# Altium footprint library ref-packages.PCBLIB: 1544 footprints (part 44 of 103) (continued)
## PQFP164 [mm] (continued)
  text "1" at -12.96,-13.93 h1.97
Mechanical 16:
  drawing of 328 lines, arcs and shapes, not listed
Mechanical 27:
  lines w0.2: -16.9,-16.9 -16.9,16.9 16.9,16.9 16.9,-16.9 -16.9,-16.9

## PQFP196 [mm]
pads (196):
  rect 0.35x1.8 smd: 1(-15.24,-18.3) 2(-14.605,-18.3) 3(-13.97,-18.3) 4(-13.335,-18.3) 5(-12.7,-18.3) 6(-12.065,-18.3) 7(-11.43,-18.3) 8(-10.795,-18.3) 9(-10.16,-18.3) 10(-9.525,-18.3) 11(-8.89,-18.3) 12(-8.255,-18.3) 13(-7.62,-18.3) 14(-6.985,-18.3) 15(-6.35,-18.3) 16(-5.715,-18.3) 17(-5.08,-18.3) 18(-4.445,-18.3) 19(-3.81,-18.3) 20(-3.175,-18.3) 21(-2.54,-18.3) 22(-1.905,-18.3) 23(-1.27,-18.3) 24(-0.635,-18.3) 25(0,-18.3) 26(0.635,-18.3) 27(1.27,-18.3) 28(1.905,-18.3) 29(2.54,-18.3) 30(3.175,-18.3) 31(3.81,-18.3) 32(4.445,-18.3) 33(5.08,-18.3) 34(5.715,-18.3) 35(6.35,-18.3) 36(6.985,-18.3) 37(7.62,-18.3) 38(8.255,-18.3) 39(8.89,-18.3) 40(9.525,-18.3) 41(10.16,-18.3) 42(10.795,-18.3) 43(11.43,-18.3) 44(12.065,-18.3) 45(12.7,-18.3) 46(13.335,-18.3) 47(13.97,-18.3) 48(14.605,-18.3) 49(15.24,-18.3) 99(15.24,18.3) 100(14.605,18.3) 101(13.97,18.3) 102(13.335,18.3) 103(12.7,18.3) 104(12.065,18.3) 105(11.43,18.3) 106(10.795,18.3) 107(10.16,18.3) 108(9.525,18.3) 109(8.89,18.3) 110(8.255,18.3) 111(7.62,18.3) 112(6.985,18.3) 113(6.35,18.3) 114(5.715,18.3) 115(5.08,18.3) 116(4.445,18.3) 117(3.81,18.3) 118(3.175,18.3) 119(2.54,18.3) 120(1.905,18.3) 121(1.27,18.3) 122(0.635,18.3) 123(0,18.3) 124(-0.635,18.3) 125(-1.27,18.3) 126(-1.905,18.3) 127(-2.54,18.3) 128(-3.175,18.3) 129(-3.81,18.3) 130(-4.445,18.3) 131(-5.08,18.3) 132(-5.715,18.3) 133(-6.35,18.3) 134(-6.985,18.3) 135(-7.62,18.3) 136(-8.255,18.3) 137(-8.89,18.3) 138(-9.525,18.3) 139(-10.16,18.3) 140(-10.795,18.3) 141(-11.43,18.3) 142(-12.065,18.3) 143(-12.7,18.3) 144(-13.335,18.3) 145(-13.97,18.3) 146(-14.605,18.3) 147(-15.24,18.3)
  rect 1.8x0.35 smd: 50(18.3,-15.24) 51(18.3,-14.605) 52(18.3,-13.97) 53(18.3,-13.335) 54(18.3,-12.7) 55(18.3,-12.065) 56(18.3,-11.43) 57(18.3,-10.795) 58(18.3,-10.16) 59(18.3,-9.525) 60(18.3,-8.89) 61(18.3,-8.255) 62(18.3,-7.62) 63(18.3,-6.985) 64(18.3,-6.35) 65(18.3,-5.715) 66(18.3,-5.08) 67(18.3,-4.445) 68(18.3,-3.81) 69(18.3,-3.175) 70(18.3,-2.54) 71(18.3,-1.905) 72(18.3,-1.27) 73(18.3,-0.635) 74(18.3,0) 75(18.3,0.635) 76(18.3,1.27) 77(18.3,1.905) 78(18.3,2.54) 79(18.3,3.175) 80(18.3,3.81) 81(18.3,4.445) 82(18.3,5.08) 83(18.3,5.715) 84(18.3,6.35) 85(18.3,6.985) 86(18.3,7.62) 87(18.3,8.255) 88(18.3,8.89) 89(18.3,9.525) 90(18.3,10.16) 91(18.3,10.795) 92(18.3,11.43) 93(18.3,12.065) 94(18.3,12.7) 95(18.3,13.335) 96(18.3,13.97) 97(18.3,14.605) 98(18.3,15.24) 148(-18.3,15.24) 149(-18.3,14.605) 150(-18.3,13.97) 151(-18.3,13.335) 152(-18.3,12.7) 153(-18.3,12.065) 154(-18.3,11.43) 155(-18.3,10.795) 156(-18.3,10.16) 157(-18.3,9.525) 158(-18.3,8.89) 159(-18.3,8.255) 160(-18.3,7.62) 161(-18.3,6.985) 162(-18.3,6.35) 163(-18.3,5.715) 164(-18.3,5.08) 165(-18.3,4.445) 166(-18.3,3.81) 167(-18.3,3.175) 168(-18.3,2.54) 169(-18.3,1.905) 170(-18.3,1.27) 171(-18.3,0.635) 172(-18.3,0) 173(-18.3,-0.635) 174(-18.3,-1.27) 175(-18.3,-1.905) 176(-18.3,-2.54) 177(-18.3,-3.175) 178(-18.3,-3.81) 179(-18.3,-4.445) 180(-18.3,-5.08) 181(-18.3,-5.715) 182(-18.3,-6.35) 183(-18.3,-6.985) 184(-18.3,-7.62) 185(-18.3,-8.255) 186(-18.3,-8.89) 187(-18.3,-9.525) 188(-18.3,-10.16) 189(-18.3,-10.795) 190(-18.3,-11.43) 191(-18.3,-12.065) 192(-18.3,-12.7) 193(-18.3,-13.335) 194(-18.3,-13.97) 195(-18.3,-14.605) 196(-18.3,-15.24)
Top Overlay:
  lines w0.203: -18.84,17.252 -18.84,18.014 ; -18.826,17.252 -17.22,15.982 ; -18.826,18.014 -18.064,18.79 -17.302,18.79 ; -18.81,-17.282 -18.81,-18.044 -18.034,-18.806 ; -18.796,-17.282 -17.19,-16.012 ; -18.034,-18.82 -17.272,-18.82 ; -17.302,18.776 -16.032,17.17 ; -17.272,-18.806 -16.002,-17.2 -15.666,-17.2 ; -17.22,-16.022 -17.22,15.9 ; -16.022,17.22 15.9,17.22 ; 15.875,-17.155 15.875,-16.52 -15.666,-16.52 -15.666,-17.2 ; 15.982,17.22 17.252,18.826 ; 16.002,-17.2 -15.666,-17.2 ; 16.032,-17.17 17.302,-18.776 ; 17.17,16.032 18.776,17.302 ; 17.22,-15.982 18.826,-17.252 ; 17.22,-15.9 17.22,16.022 ; 17.252,18.84 18.014,18.84 ; 17.302,-18.79 18.064,-18.79 18.826,-18.014 ; 18.014,18.826 18.79,18.064 18.79,17.302 ; 18.84,-18.014 18.84,-17.252
  text "1" at -15.5,-16.43 h1.08
Mechanical 16:
  drawing of 392 lines, arcs and shapes, not listed
Mechanical 27:
  lines w0.2: -19.9,-19.9 -19.9,19.9 19.9,19.9 19.9,-19.9 -19.9,-19.9

## PQFP208 [mil]
pads (208):
  rect 47.24x12.6 smd: 1(-602.36,501.97) 2(-602.36,482.28) 3(-602.36,462.6) 4(-602.36,442.91) 5(-602.36,423.23) 6(-602.36,403.54) 7(-602.36,383.86) 8(-602.36,364.17) 9(-602.36,344.49) 10(-602.36,324.8) 11(-602.36,305.12) 12(-602.36,285.43) 13(-602.36,265.75) 14(-602.36,246.06) 15(-602.36,226.38) 16(-602.36,206.69) 17(-602.36,187.01) 18(-602.36,167.32) 19(-602.36,147.64) 20(-602.36,127.95) 21(-602.36,108.27) 22(-602.36,88.58) 23(-602.36,68.9) 24(-602.36,49.21) 25(-602.36,29.53) 26(-602.36,9.84) 27(-602.36,-9.84) 28(-602.36,-29.53) 29(-602.36,-49.21) 30(-602.36,-68.9) 31(-602.36,-88.58) 32(-602.36,-108.27) 33(-602.36,-127.95) 34(-602.36,-147.64) 35(-602.36,-167.32) 36(-602.36,-187.01) 37(-602.36,-206.69) 38(-602.36,-226.38) 39(-602.36,-246.06) 40(-602.36,-265.75) 41(-602.36,-285.43) 42(-602.36,-305.12) 43(-602.36,-324.8) 44(-602.36,-344.49) 45(-602.36,-364.17) 46(-602.36,-383.86) 47(-602.36,-403.54) 48(-602.36,-423.23) 49(-602.36,-442.91) 50(-602.36,-462.6) 51(-602.36,-482.28) 52(-602.36,-501.97) 105(602.36,-501.97) 106(602.36,-482.28) 107(602.36,-462.6) 108(602.36,-442.91) 109(602.36,-423.23) 110(602.36,-403.54) 111(602.36,-383.86) 112(602.36,-364.17) 113(602.36,-344.49) 114(602.36,-324.8) 115(602.36,-305.12) 116(602.36,-285.43) 117(602.36,-265.75) 118(602.36,-246.06) 119(602.36,-226.38) 120(602.36,-206.69) 121(602.36,-187.01) 122(602.36,-167.32) 123(602.36,-147.64) 124(602.36,-127.95) 125(602.36,-108.27) 126(602.36,-88.58) 127(602.36,-68.9) 128(602.36,-49.21) 129(602.36,-29.53) 130(602.36,-9.84) 131(602.36,9.84) 132(602.36,29.53) 133(602.36,49.21) 134(602.36,68.9) 135(602.36,88.58) 136(602.36,108.27) 137(602.36,127.95) 138(602.36,147.64) 139(602.36,167.32) 140(602.36,187.01) 141(602.36,206.69) 142(602.36,226.38) 143(602.36,246.06) 144(602.36,265.75) 145(602.36,285.43) 146(602.36,305.12) 147(602.36,324.8) 148(602.36,344.49) 149(602.36,364.17) 150(602.36,383.86) 151(602.36,403.54) 152(602.36,423.23) 153(602.36,442.91) 154(602.36,462.6) 155(602.36,482.28) 156(602.36,501.97)
  rect 12.6x47.24 smd: 53(-501.97,-602.36) 54(-482.28,-602.36) 55(-462.6,-602.36) 56(-442.91,-602.36) 57(-423.23,-602.36) 58(-403.54,-602.36) 59(-383.86,-602.36) 60(-364.17,-602.36) 61(-344.49,-602.36) 62(-324.8,-602.36) 63(-305.12,-602.36) 64(-285.43,-602.36) 65(-265.75,-602.36) 66(-246.06,-602.36) 67(-226.38,-602.36) 68(-206.69,-602.36) 69(-187.01,-602.36) 70(-167.32,-602.36) 71(-147.64,-602.36) 72(-127.95,-602.36) 73(-108.27,-602.36) 74(-88.58,-602.36) 75(-68.9,-602.36) 76(-49.21,-602.36) 77(-29.53,-602.36) 78(-9.84,-602.36) 79(9.84,-602.36) 80(29.53,-602.36) 81(49.21,-602.36) 82(68.9,-602.36) 83(88.58,-602.36) 84(108.27,-602.36) 85(127.95,-602.36) 86(147.64,-602.36) 87(167.32,-602.36) 88(187.01,-602.36) 89(206.69,-602.36) 90(226.38,-602.36) 91(246.06,-602.36) 92(265.75,-602.36) 93(285.43,-602.36) 94(305.12,-602.36) 95(324.8,-602.36) 96(344.49,-602.36) 97(364.17,-602.36) 98(383.86,-602.36) 99(403.54,-602.36) 100(423.23,-602.36) 101(442.91,-602.36) 102(462.6,-602.36) 103(482.28,-602.36) 104(501.97,-602.36) 157(501.97,602.36) 158(482.28,602.36) 159(462.6,602.36) 160(442.91,602.36) 161(423.23,602.36) 162(403.54,602.36) 163(383.86,602.36) 164(364.17,602.36) 165(344.49,602.36) 166(324.8,602.36) 167(305.12,602.36) 168(285.43,602.36) 169(265.75,602.36) 170(246.06,602.36) 171(226.38,602.36) 172(206.69,602.36) 173(187.01,602.36) 174(167.32,602.36) 175(147.64,602.36) 176(127.95,602.36) 177(108.27,602.36) 178(88.58,602.36) 179(68.9,602.36) 180(49.21,602.36) 181(29.53,602.36) 182(9.84,602.36) 183(-9.84,602.36) 184(-29.53,602.36) 185(-49.21,602.36) 186(-68.9,602.36) 187(-88.58,602.36) 188(-108.27,602.36) 189(-127.95,602.36) 190(-147.64,602.36) 191(-167.32,602.36) 192(-187.01,602.36) 193(-206.69,602.36) 194(-226.38,602.36) 195(-246.06,602.36) 196(-265.75,602.36) 197(-285.43,602.36) 198(-305.12,602.36) 199(-324.8,602.36) 200(-344.49,602.36) 201(-364.17,602.36) 202(-383.86,602.36) 203(-403.54,602.36) 204(-423.23,602.36) 205(-442.91,602.36) 206(-462.6,602.36) 207(-482.28,602.36) 208(-501.97,602.36)
Top Overlay:
  drawing of 214 lines, arcs and shapes, not listed
Mechanical 13:
  text "Analog Devices PQFP 208" at -530.32,-530.32 h49.6
Mechanical 16:
  drawing of 208 lines, arcs and shapes, not listed

## PQFP240 [mil]
pads (240):
  rect 47.24x12.6 smd: 1(-669.29,580.71) 2(-669.29,561.02) 3(-669.29,541.34) 4(-669.29,521.65) 5(-669.29,501.97) 6(-669.29,482.28) 7(-669.29,462.6) 8(-669.29,442.91) 9(-669.29,423.23) 10(-669.29,403.54) 11(-669.29,383.86) 12(-669.29,364.17) 13(-669.29,344.49) 14(-669.29,324.8) 15(-669.29,305.12) 16(-669.29,285.43) 17(-669.29,265.75) 18(-669.29,246.06) 19(-669.29,226.38) 20(-669.29,206.69) 21(-669.29,187.01) 22(-669.29,167.32) 23(-669.29,147.64) 24(-669.29,127.95) 25(-669.29,108.27) 26(-669.29,88.58) 27(-669.29,68.9) 28(-669.29,49.21) 29(-669.29,29.53) 30(-669.29,9.84) 31(-669.29,-9.84) 32(-669.29,-29.53) 33(-669.29,-49.21) 34(-669.29,-68.9) 35(-669.29,-88.58) 36(-669.29,-108.27) 37(-669.29,-127.95) 38(-669.29,-147.64) 39(-669.29,-167.32) 40(-669.29,-187.01) 41(-669.29,-206.69) 42(-669.29,-226.38) 43(-669.29,-246.06) 44(-669.29,-265.75) 45(-669.29,-285.43) 46(-669.29,-305.12) 47(-669.29,-324.8) 48(-669.29,-344.49) 49(-669.29,-364.17) 50(-669.29,-383.86) 51(-669.29,-403.54) 52(-669.29,-423.23) 53(-669.29,-442.91) 54(-669.29,-462.6) 55(-669.29,-482.28) 56(-669.29,-501.97) 57(-669.29,-521.65) 58(-669.29,-541.34) 59(-669.29,-561.02) 60(-669.29,-580.71) 121(669.29,-580.71) 122(669.29,-561.02) 123(669.29,-541.34) 124(669.29,-521.65) 125(669.29,-501.97) 126(669.29,-482.28) 127(669.29,-462.6) 128(669.29,-442.91) 129(669.29,-423.23) 130(669.29,-403.54) 131(669.29,-383.86) 132(669.29,-364.17) 133(669.29,-344.49) 134(669.29,-324.8) 135(669.29,-305.12) 136(669.29,-285.43) 137(669.29,-265.75) 138(669.29,-246.06) 139(669.29,-226.38) 140(669.29,-206.69) 141(669.29,-187.01) 142(669.29,-167.32) 143(669.29,-147.64) 144(669.29,-127.95) 145(669.29,-108.27) 146(669.29,-88.58) 147(669.29,-68.9) 148(669.29,-49.21) 149(669.29,-29.53) 150(669.29,-9.84) 151(669.29,9.84) 152(669.29,29.53) 153(669.29,49.21) 154(669.29,68.9) 155(669.29,88.58) 156(669.29,108.27) 157(669.29,127.95) 158(669.29,147.64) 159(669.29,167.32) 160(669.29,187.01) 161(669.29,206.69) 162(669.29,226.38) 163(669.29,246.06) 164(669.29,265.75) 165(669.29,285.43) 166(669.29,305.12) 167(669.29,324.8) 168(669.29,344.49) 169(669.29,364.17) 170(669.29,383.86) 171(669.29,403.54) 172(669.29,423.23) 173(669.29,442.91) 174(669.29,462.6) 175(669.29,482.28) 176(669.29,501.97) 177(669.29,521.65) 178(669.29,541.34) 179(669.29,561.02) 180(669.29,580.71)
  rect 12.6x47.24 smd: 61(-580.71,-669.29) 62(-561.02,-669.29) 63(-541.34,-669.29) 64(-521.65,-669.29) 65(-501.97,-669.29) 66(-482.28,-669.29) 67(-462.6,-669.29) 68(-442.91,-669.29) 69(-423.23,-669.29) 70(-403.54,-669.29) 71(-383.86,-669.29) 72(-364.17,-669.29) 73(-344.49,-669.29) 74(-324.8,-669.29) 75(-305.12,-669.29) 76(-285.43,-669.29) 77(-265.75,-669.29) 78(-246.06,-669.29) 79(-226.38,-669.29) 80(-206.69,-669.29) 81(-187.01,-669.29) 82(-167.32,-669.29) 83(-147.64,-669.29) 84(-127.95,-669.29) 85(-108.27,-669.29) 86(-88.58,-669.29) 87(-68.9,-669.29) 88(-49.21,-669.29) 89(-29.53,-669.29) 90(-9.84,-669.29) 91(9.84,-669.29) 92(29.53,-669.29) 93(49.21,-669.29) 94(68.9,-669.29) 95(88.58,-669.29) 96(108.27,-669.29) 97(127.95,-669.29) 98(147.64,-669.29) 99(167.32,-669.29) 100(187.01,-669.29) 101(206.69,-669.29) 102(226.38,-669.29) 103(246.06,-669.29) 104(265.75,-669.29) 105(285.43,-669.29) 106(305.12,-669.29) 107(324.8,-669.29) 108(344.49,-669.29) 109(364.17,-669.29) 110(383.86,-669.29) 111(403.54,-669.29) 112(423.23,-669.29) 113(442.91,-669.29) 114(462.6,-669.29) 115(482.28,-669.29) 116(501.97,-669.29) 117(521.65,-669.29) 118(541.34,-669.29) 119(561.02,-669.29) 120(580.71,-669.29) 181(580.71,669.29) 182(561.02,669.29) 183(541.34,669.29) 184(521.65,669.29) 185(501.97,669.29) 186(482.28,669.29) 187(462.6,669.29) 188(442.91,669.29) 189(423.23,669.29) 190(403.54,669.29) 191(383.86,669.29) 192(364.17,669.29) 193(344.49,669.29) 194(324.8,669.29) 195(305.12,669.29) 196(285.43,669.29) 197(265.75,669.29) 198(246.06,669.29) 199(226.38,669.29) 200(206.69,669.29) 201(187.01,669.29) 202(167.32,669.29) 203(147.64,669.29) 204(127.95,669.29) 205(108.27,669.29) 206(88.58,669.29) 207(68.9,669.29) 208(49.21,669.29) 209(29.53,669.29) 210(9.84,669.29) 211(-9.84,669.29) 212(-29.53,669.29) 213(-49.21,669.29) 214(-68.9,669.29) 215(-88.58,669.29) 216(-108.27,669.29) 217(-127.95,669.29) 218(-147.64,669.29) 219(-167.32,669.29) 220(-187.01,669.29) 221(-206.69,669.29) 222(-226.38,669.29) 223(-246.06,669.29) 224(-265.75,669.29) 225(-285.43,669.29) 226(-305.12,669.29) 227(-324.8,669.29) 228(-344.49,669.29) 229(-364.17,669.29) 230(-383.86,669.29) 231(-403.54,669.29) 232(-423.23,669.29) 233(-442.91,669.29) 234(-462.6,669.29) 235(-482.28,669.29) 236(-501.97,669.29) 237(-521.65,669.29) 238(-541.34,669.29) 239(-561.02,669.29) 240(-580.71,669.29)
Top Overlay:
  drawing of 247 lines, arcs and shapes, not listed
Mechanical 13:
  text "Analog Devices PQFP 240" at -550,-550 h49.6
Mechanical 16:
  drawing of 240 lines, arcs and shapes, not listed

## PQFP244 [mm]
pads (244):
  rect 0.35x1.8 smd: 1(-19.05,-20.5) 2(-18.415,-20.5) 3(-17.78,-20.5) 4(-17.145,-20.5) 5(-16.51,-20.5) 6(-15.875,-20.5) 7(-15.24,-20.5) 8(-14.605,-20.5) 9(-13.97,-20.5) 10(-13.335,-20.5) 11(-12.7,-20.5) 12(-12.065,-20.5) 13(-11.43,-20.5) 14(-10.795,-20.5) 15(-10.16,-20.5) 16(-9.525,-20.5) 17(-8.89,-20.5) 18(-8.255,-20.5) 19(-7.62,-20.5) 20(-6.985,-20.5) 21(-6.35,-20.5) 22(-5.715,-20.5) 23(-5.08,-20.5) 24(-4.445,-20.5) 25(-3.81,-20.5) 26(-3.175,-20.5) 27(-2.54,-20.5) 28(-1.905,-20.5) 29(-1.27,-20.5) 30(-0.635,-20.5) 31(0,-20.5) 32(0.635,-20.5) 33(1.27,-20.5) 34(1.905,-20.5) 35(2.54,-20.5) 36(3.175,-20.5) 37(3.81,-20.5) 38(4.445,-20.5) 39(5.08,-20.5) 40(5.715,-20.5) 41(6.35,-20.5) 42(6.985,-20.5) 43(7.62,-20.5) 44(8.255,-20.5) 45(8.89,-20.5) 46(9.525,-20.5) 47(10.16,-20.5) 48(10.795,-20.5) 49(11.43,-20.5) 50(12.065,-20.5) 51(12.7,-20.5) 52(13.335,-20.5) 53(13.97,-20.5) 54(14.605,-20.5) 55(15.24,-20.5) 56(15.875,-20.5) 57(16.51,-20.5) 58(17.145,-20.5) 59(17.78,-20.5) 60(18.415,-20.5) 61(19.05,-20.5) 123(19.05,20.5) 124(18.415,20.5) 125(17.78,20.5) 126(17.145,20.5) 127(16.51,20.5) 128(15.875,20.5) 129(15.24,20.5) 130(14.605,20.5) 131(13.97,20.5) 132(13.335,20.5) 133(12.7,20.5) 134(12.065,20.5) 135(11.43,20.5) 136(10.795,20.5) 137(10.16,20.5) 138(9.525,20.5) 139(8.89,20.5) 140(8.255,20.5) 141(7.62,20.5) 142(6.985,20.5) 143(6.35,20.5) 144(5.715,20.5) 145(5.08,20.5) 146(4.445,20.5) 147(3.81,20.5) 148(3.175,20.5) 149(2.54,20.5) 150(1.905,20.5) 151(1.27,20.5) 152(0.635,20.5) 153(0,20.5) 154(-0.635,20.5) 155(-1.27,20.5) 156(-1.905,20.5) 157(-2.54,20.5) 158(-3.175,20.5) 159(-3.81,20.5) 160(-4.445,20.5) 161(-5.08,20.5) 162(-5.715,20.5) 163(-6.35,20.5) 164(-6.985,20.5) 165(-7.62,20.5) 166(-8.255,20.5) 167(-8.89,20.5) 168(-9.525,20.5) 169(-10.16,20.5) 170(-10.795,20.5) 171(-11.43,20.5) 172(-12.065,20.5) 173(-12.7,20.5) 174(-13.335,20.5) 175(-13.97,20.5) 176(-14.605,20.5) 177(-15.24,20.5) 178(-15.875,20.5) 179(-16.51,20.5) 180(-17.145,20.5) 181(-17.78,20.5) 182(-18.415,20.5) 183(-19.05,20.5)
  rect 1.8x0.35 smd: 62(20.5,-19.05) 63(20.5,-18.415) 64(20.5,-17.78) 65(20.5,-17.145) 66(20.5,-16.51) 67(20.5,-15.875) 68(20.5,-15.24) 69(20.5,-14.605) 70(20.5,-13.97) 71(20.5,-13.335) 72(20.5,-12.7) 73(20.5,-12.065) 74(20.5,-11.43) 75(20.5,-10.795) 76(20.5,-10.16) 77(20.5,-9.525) 78(20.5,-8.89) 79(20.5,-8.255) 80(20.5,-7.62) 81(20.5,-6.985) 82(20.5,-6.35) 83(20.5,-5.715) 84(20.5,-5.08) 85(20.5,-4.445) 86(20.5,-3.81) 87(20.5,-3.175) 88(20.5,-2.54) 89(20.5,-1.905) 90(20.5,-1.27) 91(20.5,-0.635) 92(20.5,0) 93(20.5,0.635) 94(20.5,1.27) 95(20.5,1.905) 96(20.5,2.54) 97(20.5,3.175) 98(20.5,3.81) 99(20.5,4.445) 100(20.5,5.08) 101(20.5,5.715) 102(20.5,6.35) 103(20.5,6.985) 104(20.5,7.62) 105(20.5,8.255) 106(20.5,8.89) 107(20.5,9.525) 108(20.5,10.16) 109(20.5,10.795) 110(20.5,11.43) 111(20.5,12.065) 112(20.5,12.7) 113(20.5,13.335) 114(20.5,13.97) 115(20.5,14.605) 116(20.5,15.24) 117(20.5,15.875) 118(20.5,16.51) 119(20.5,17.145) 120(20.5,17.78) 121(20.5,18.415) 122(20.5,19.05) 184(-20.5,19.05) 185(-20.5,18.415) 186(-20.5,17.78) 187(-20.5,17.145) 188(-20.5,16.51) 189(-20.5,15.875) 190(-20.5,15.24) 191(-20.5,14.605) 192(-20.5,13.97) 193(-20.5,13.335) 194(-20.5,12.7) 195(-20.5,12.065) 196(-20.5,11.43) 197(-20.5,10.795) 198(-20.5,10.16) 199(-20.5,9.525) 200(-20.5,8.89) 201(-20.5,8.255) 202(-20.5,7.62) 203(-20.5,6.985) 204(-20.5,6.35) 205(-20.5,5.715) 206(-20.5,5.08) 207(-20.5,4.445) 208(-20.5,3.81) 209(-20.5,3.175) 210(-20.5,2.54) 211(-20.5,1.905) 212(-20.5,1.27) 213(-20.5,0.635) 214(-20.5,0) 215(-20.5,-0.635) 216(-20.5,-1.27) 217(-20.5,-1.905) 218(-20.5,-2.54) 219(-20.5,-3.175) 220(-20.5,-3.81) 221(-20.5,-4.445) 222(-20.5,-5.08) 223(-20.5,-5.715) 224(-20.5,-6.35) 225(-20.5,-6.985) 226(-20.5,-7.62) 227(-20.5,-8.255) 228(-20.5,-8.89) 229(-20.5,-9.525) 230(-20.5,-10.16) 231(-20.5,-10.795) 232(-20.5,-11.43) 233(-20.5,-12.065) 234(-20.5,-12.7) 235(-20.5,-13.335) 236(-20.5,-13.97) 237(-20.5,-14.605) 238(-20.5,-15.24) 239(-20.5,-15.875) 240(-20.5,-16.51) 241(-20.5,-17.145) 242(-20.5,-17.78) 243(-20.5,-18.415) 244(-20.5,-19.05)
Top Overlay:
  lines w0.203: -19.431,19.4 19.476,19.4 ; -19.4,-19.431 -19.4,19.476 ; 19.05,-19.355 18.415,-18.72 -18.841,-18.72 -19.476,-19.4 19.431,-19.4 ; 19.4,-19.476 19.4,19.431
  text "1" at -18.167,-18.376 h2.76
Mechanical 16:
  drawing of 488 lines, arcs and shapes, not listed
Mechanical 27:
  lines w0.2: -21.9,-21.9 -21.9,21.9 21.9,21.9 21.9,-21.9 -21.9,-21.9

## PQFP-44 [mil]
pads (44):
  rect 20x79 smd: 1(-155,-264) 2(-124,-264) 3(-93,-264) 4(-62,-264) 5(-31,-264) 6(0,-264) 7(31,-264) 8(62,-264) 9(93,-264) 10(124,-264) 11(155,-264) 23(155,234) 24(124,234) 25(93,234) 26(62,234) 27(31,234) 28(0,234) 29(-31,234) 30(-62,234) 31(-93,234) 32(-124,234) 33(-155,234)
  rect 79x20 smd: 12(249,-170) 13(249,-139) 14(249,-108) 15(249,-77) 16(249,-46) 17(249,-15) 18(249,16) 19(249,47) 20(249,78) 21(249,109) 22(249,140) 34(-249,140) 35(-249,109) 36(-249,78) 37(-249,47) 38(-249,16) 39(-249,-15) 40(-249,-46) 41(-249,-77) 42(-249,-108) 43(-249,-139) 44(-249,-170)
Top Overlay:
  circle w2: c-147,-159 r14
  rectangle: 195,134 258,146
  rectangle: -161,180 -149,243
  rectangle: -130,180 -118,243
  rectangle: -99,180 -87,243
  rectangle: -68,180 -56,243
  rectangle: -37,180 -25,243
  rectangle: -6,180 6,243
  rectangle: 25,180 37,243
  rectangle: 56,180 68,243
  rectangle: 87,180 99,243
  rectangle: 118,180 130,243
  rectangle: 149,180 161,243
  rectangle: 195,103 258,115
  rectangle: 195,72 258,84
  rectangle: 195,41 258,53
  rectangle: 195,10 258,22
  rectangle: 195,-21 258,-9
  rectangle: 195,-52 258,-40
  rectangle: 195,-83 258,-71
  rectangle: 195,-114 258,-102
  rectangle: 195,-145 258,-133
  rectangle: 195,-176 258,-164
  rectangle: 149,-273 161,-210
  rectangle: 118,-273 130,-210
  rectangle: 87,-273 99,-210
  rectangle: 56,-273 68,-210
  rectangle: 25,-273 37,-210
  rectangle: -6,-273 6,-210
  rectangle: -37,-273 -25,-210
  rectangle: -68,-273 -56,-210
  rectangle: -99,-273 -87,-210
  rectangle: -130,-273 -118,-210
  rectangle: -161,-273 -149,-210
  rectangle: -258,-176 -195,-164
  rectangle: -258,-145 -195,-133
  rectangle: -258,-114 -195,-102
  rectangle: -258,-83 -195,-71
  rectangle: -258,-52 -195,-40
  rectangle: -258,-21 -195,-9
  rectangle: -258,10 -195,22
  rectangle: -258,41 -195,53
  rectangle: -258,72 -195,84
  rectangle: -258,103 -195,115
  rectangle: -258,134 -195,146
  lines w2: -193,-183 -174,-166 ; -193,178 -174,159 ; -167,-208 -148,-189 ; 193,-208 176,-189 ; 193,178 176,159 ; -174,-166 -174,159 ; -174,-166 -148,-189 ; -174,159 176,159 ; -148,-189 176,-189 ; 176,-189 176,159
  lines w5: -193,-183 -193,178 193,178 193,-208 -167,-208 -193,-183

## PSO28 [mil]
pads (28):
  rect 15.75x47.24 smd: 1(-166.34,-115.16) 2(-140.75,-115.16) 3(-115.16,-115.16) 4(-89.57,-115.16) 5(-63.98,-115.16) 6(-38.39,-115.16) 7(-12.8,-115.16) 8(12.8,-115.16) 9(38.39,-115.16) 10(63.98,-115.16) 11(89.57,-115.16) 12(115.16,-115.16) 13(140.75,-115.16) 14(166.34,-115.16) 15(166.34,115.16) 16(140.75,115.16) 17(115.16,115.16) 18(89.57,115.16) 19(63.98,115.16) 20(38.39,115.16) 21(12.8,115.16) 22(-12.8,115.16) 23(-38.39,115.16) 24(-63.98,115.16) 25(-89.57,115.16) 26(-115.16,115.16) 27(-140.75,115.16) 28(-166.34,115.16)
Top Overlay:
  circle w10: c-157.48,-47.24 r11.81
  lines w10: -188.98,-82.68 188.98,-82.68 188.98,82.68 -188.98,82.68 -188.98,-82.68
Mechanical 16:
  rectangle: -172.24,-129.92 -160.43,-88.58
  rectangle: -146.65,-129.92 -134.84,-88.58
  rectangle: -121.06,-129.92 -109.25,-88.58
  rectangle: -95.47,-129.92 -83.66,-88.58
  rectangle: -69.88,-129.92 -58.07,-88.58
  rectangle: -44.29,-129.92 -32.48,-88.58
  rectangle: -18.7,-129.92 -6.89,-88.58
  rectangle: 6.89,-129.92 18.7,-88.58
  rectangle: 32.48,-129.92 44.29,-88.58
  rectangle: 58.07,-129.92 69.88,-88.58
  rectangle: 83.66,-129.92 95.47,-88.58
  rectangle: 109.25,-129.92 121.06,-88.58
  rectangle: 134.84,-129.92 146.65,-88.58
  rectangle: 160.43,-129.92 172.24,-88.58
  rectangle: 160.43,88.58 172.24,129.92
  rectangle: 134.84,88.58 146.65,129.92
  rectangle: 109.25,88.58 121.06,129.92
  rectangle: 83.66,88.58 95.47,129.92
  rectangle: 58.07,88.58 69.88,129.92
  rectangle: 32.48,88.58 44.29,129.92
  rectangle: 6.89,88.58 18.7,129.92
  rectangle: -18.7,88.58 -6.89,129.92
  rectangle: -44.29,88.58 -32.48,129.92
  rectangle: -69.88,88.58 -58.07,129.92
  rectangle: -95.47,88.58 -83.66,129.92
  rectangle: -121.06,88.58 -109.25,129.92
  rectangle: -146.65,88.58 -134.84,129.92
  rectangle: -172.24,88.58 -160.43,129.92

## PSOP44L [mil]
pads (44):
  rect 19.69x74.8 smd: 1(-525,-296.06) 2(-475,-296.06) 3(-425,-296.06) 4(-375,-296.06) 5(-325,-296.06) 6(-275,-296.06) 7(-225,-296.06) 8(-175,-296.06) 9(-125,-296.06) 10(-75,-296.06) 11(-25,-296.06) 12(25,-296.06) 13(75,-296.06) 14(125,-296.06) 15(175,-296.06) 16(225,-296.06) 17(275,-296.06) 18(325,-296.06) 19(375,-296.06) 20(425,-296.06) 21(475,-296.06) 22(525,-296.06) 23(525,296.06) 24(475,296.06) 25(425,296.06) 26(375,296.06) 27(325,296.06) 28(275,296.06) 29(225,296.06) 30(175,296.06) 31(125,296.06) 32(75,296.06) 33(25,296.06) 34(-25,296.06) 35(-75,296.06) 36(-125,296.06) 37(-175,296.06) 38(-225,296.06) 39(-275,296.06) 40(-325,296.06) 41(-375,296.06) 42(-425,296.06) 43(-475,296.06) 44(-525,296.06)
Top Overlay:
  circle w8: c-511.81,-206.69 r19.69
Mechanical 16:
  rectangle: -535,-320 -515,-260
  rectangle: -485,-320 -465,-260
  rectangle: -435,-320 -415,-260
  rectangle: -385,-320 -365,-260
  rectangle: -335,-320 -315,-260
  rectangle: -285,-320 -265,-260
  rectangle: -235,-320 -215,-260
  rectangle: -185,-320 -165,-260
  rectangle: -135,-320 -115,-260
  rectangle: -85,-320 -65,-260
  rectangle: -35,-320 -15,-260
  rectangle: 15,-320 35,-260
  rectangle: 65,-320 85,-260
  rectangle: 115,-320 135,-260
  rectangle: 165,-320 185,-260
  rectangle: 215,-320 235,-260
  rectangle: 265,-320 285,-260
  rectangle: 315,-320 335,-260
  rectangle: 365,-320 385,-260
  rectangle: 415,-320 435,-260
  rectangle: 465,-320 485,-260
  rectangle: 515,-320 535,-260
  rectangle: 515,260 535,320
  rectangle: 465,260 485,320
  rectangle: 415,260 435,320
  rectangle: 365,260 385,320
  rectangle: 315,260 335,320
  rectangle: 265,260 285,320
  rectangle: 215,260 235,320
  rectangle: 165,260 185,320
  rectangle: 115,260 135,320
  rectangle: 65,260 85,320
  rectangle: 15,260 35,320
  rectangle: -35,260 -15,320
  rectangle: -85,260 -65,320
  rectangle: -135,260 -115,320
  rectangle: -185,260 -165,320
  rectangle: -235,260 -215,320
  rectangle: -285,260 -265,320
  rectangle: -335,260 -315,320
  rectangle: -385,260 -365,320
  rectangle: -435,260 -415,320
  rectangle: -485,260 -465,320
  rectangle: -535,260 -515,320
  lines w8: -555.12,-259.84 -555.12,259.84 555.12,259.84 555.12,-259.84 -555.12,-259.84

## PSSO20 [mm]
pads (20):
  rect 0.3x1 smd: 1(-2.925,-3) 2(-2.275,-3) 3(-1.625,-3) 4(-0.975,-3) 5(-0.325,-3) 6(0.325,-3) 7(0.975,-3) 8(1.625,-3) 9(2.275,-3) 10(2.925,-3) 11(2.925,3) 12(2.275,3) 13(1.625,3) 14(0.975,3) 15(0.325,3) 16(-0.325,3) 17(-0.975,3) 18(-1.625,3) 19(-2.275,3) 20(-2.925,3)
Top Overlay:
  circle w0.254: c-2.5,-1.3 r0.158
  lines w0.254: -3.25,-2.1 -3.25,2.1 3.25,2.1 3.25,-2.1 -3.25,-2.1
Mechanical 16:
  rectangle: -3.05,-3.25 -2.8,-2.15
  rectangle: -2.4,-3.25 -2.15,-2.15
  rectangle: -1.75,-3.25 -1.5,-2.15
  rectangle: -1.1,-3.25 -0.85,-2.15
  rectangle: -0.45,-3.25 -0.2,-2.15
  rectangle: 0.2,-3.25 0.45,-2.15
  rectangle: 0.85,-3.25 1.1,-2.15
  rectangle: 1.5,-3.25 1.75,-2.15
  rectangle: 2.15,-3.25 2.4,-2.15
  rectangle: 2.8,-3.25 3.05,-2.15
  rectangle: 2.8,2.15 3.05,3.25
  rectangle: 2.15,2.15 2.4,3.25
  rectangle: 1.5,2.15 1.75,3.25
  rectangle: 0.85,2.15 1.1,3.25
  rectangle: 0.2,2.15 0.45,3.25
  rectangle: -0.45,2.15 -0.2,3.25
  rectangle: -1.1,2.15 -0.85,3.25
  rectangle: -1.75,2.15 -1.5,3.25
  rectangle: -2.4,2.15 -2.15,3.25
  rectangle: -3.05,2.15 -2.8,3.25

## Q5-DD [mm]
pads (6):
  rect 1x3.4 smd: 1(-3.4,-7.875) 2(-1.7,-7.875) 3(0,-7.875) 4(1.7,-7.875) 5(3.4,-7.875)
  rect 8.5x9.6 smd: 6(0,0.325)
Top Overlay:
  rectangle: -0.508,-6.477 0.508,-5.461
  rectangle: -3.908,-6.477 -2.892,-5.461
  rectangle: -2.208,-6.477 -1.192,-5.461
  rectangle: 1.192,-6.477 2.208,-5.461
  rectangle: 2.892,-6.477 3.908,-5.461
  rectangle: -3.8,-5.5 -3,-5.1
  rectangle: -2.1,-5.5 -1.3,-5.1
  rectangle: -0.4,-5.5 0.4,-5.1
  rectangle: 1.3,-5.5 2.1,-5.1
  rectangle: 3,-5.5 3.8,-5.1
Mechanical 16:
  circle w0.254: c0,-0.175 r1
  rectangle: -0.381,-8.768 0.381,-5.974
  rectangle: -3.781,-8.768 -3.019,-5.974
  rectangle: -2.081,-8.768 -1.319,-5.974
  rectangle: 1.319,-8.768 2.081,-5.974
  rectangle: 3.019,-8.768 3.781,-5.974
  region: 0,0 0.254,0 0.254,0.254 0,0.254
  lines w0.203: -4.917,-5.014 4.917,-5.014 4.917,3.99 -4.917,3.99 -4.917,-5.014